# Altium footprint library ref-packages.PCBLIB: 1543 footprints (part 42 of 103) (continued)
## PLCC-S28 [mil]
pads (28):
  round 48 hole 32: 1(50,150)
  oct 48x48 hole 32: 2(-50,250) 3(-50,150) 4(-150,250) 5(-250,150) 6(-150,150) 7(-250,50) 8(-150,50) 9(-250,-50) 10(-150,-50) 11(-250,-150) 12(-150,-250) 13(-150,-150) 14(-50,-250) 15(-50,-150) 16(50,-250) 17(50,-150) 18(150,-250) 19(250,-150) 20(150,-150) 21(250,-50) 22(150,-50) 23(250,50) 24(150,50) 25(250,150) 26(150,250) 27(150,150) 28(50,250)
Top Overlay:
  lines w6: -225,-185 -310,-270 -270,-310 -185,-225 ; -225,-115 -310,-115 -310,-85 -225,-85 ; -225,-15 -310,-15 -310,15 -225,15 ; -225,85 -310,85 -310,115 -225,115 ; -225,175 -175,225 ; -115,-225 -115,-310 -85,-310 -85,-225 ; -115,225 -115,310 -85,310 -85,225 ; -15,-225 -15,-310 15,-310 15,-225 ; -15,225 -15,310 15,310 15,225 ; 0,125 0,220 ; 85,-225 85,-310 115,-310 115,-225 ; 85,225 85,310 115,310 115,225 ; 165,-225 225,-225 225,-165 ; 185,225 270,310 310,270 225,185 ; 225,-115 310,-115 310,-85 225,-85 ; 225,-15 310,-15 310,15 225,15 ; 225,85 310,85 310,115 225,115 ; -350,-350 -350,300 -300,350 350,350 350,-350 -350,-350
  lines w20: -25,195 25,195 0,220 -25,195
Mechanical 16:
  circle w6: c-100,100 r50
  circle w6: c100,100 r50
  circle w6: c-100,-100 r50
  circle w6: c100,-100 r50
  lines w6: -225,-185 -225,-165 -310,-165 -310,-135 -225,-135 -225,-115 ; -225,-85 -225,-65 -310,-65 -310,-35 -225,-35 -225,-15 ; -225,15 -225,35 -310,35 -310,65 -225,65 -225,85 ; -225,115 -225,135 -310,135 -310,165 -225,165 -225,175 ; -185,-225 -165,-225 -165,-310 -135,-310 -135,-225 -115,-225 ; -175,225 -165,225 -165,310 -135,310 -135,225 -115,225 ; -85,-225 -65,-225 -65,-310 -35,-310 -35,-225 -15,-225 ; -85,225 -65,225 -65,310 -35,310 -35,225 -15,225 ; 15,-225 35,-225 35,-310 65,-310 65,-225 85,-225 ; 15,225 35,225 35,310 65,310 65,225 85,225 ; 115,-225 135,-225 135,-310 165,-310 165,-225 ; 115,225 135,225 135,310 165,310 165,225 185,225 ; 225,-165 310,-165 310,-135 225,-135 225,-115 ; 225,-85 225,-65 310,-65 310,-35 225,-35 225,-15 ; 225,15 225,35 310,35 310,65 225,65 225,85 ; 225,115 225,135 310,135 310,165 225,165 225,185

## PLCC-S32 [mil]
pads (32):
  round 48 hole 32: 1(50,200)
  oct 48x48 hole 32: 2(-50,300) 3(-50,200) 4(-150,300) 5(-250,200) 6(-150,200) 7(-250,100) 8(-150,100) 9(-250,0) 10(-150,0) 11(-250,-100) 12(-150,-100) 13(-250,-200) 14(-150,-300) 15(-150,-200) 16(-50,-300) 17(-50,-200) 18(50,-300) 19(50,-200) 20(150,-300) 21(250,-200) 22(150,-200) 23(250,-100) 24(150,-100) 25(250,0) 26(150,0) 27(250,100) 28(150,100) 29(250,200) 30(150,300) 31(150,200) 32(50,300)
Top Overlay:
  lines w6: -225,-235 -310,-320 -270,-360 -185,-275 ; -225,-165 -310,-165 -310,-135 -225,-135 ; -225,-65 -310,-65 -310,-35 -225,-35 ; -225,35 -310,35 -310,65 -225,65 ; -225,135 -310,135 -310,165 -225,165 ; -225,225 -175,275 ; -115,-275 -115,-360 -85,-360 -85,-275 ; -115,275 -115,360 -85,360 -85,275 ; -15,-275 -15,-360 15,-360 15,-275 ; -15,275 -15,360 15,360 15,275 ; 0,175 0,265 ; 85,-275 85,-360 115,-360 115,-275 ; 85,275 85,360 115,360 115,275 ; 165,-275 225,-275 225,-215 ; 185,275 270,360 310,320 225,235 ; 225,-165 310,-165 310,-135 225,-135 ; 225,-65 310,-65 310,-35 225,-35 ; 225,35 310,35 310,65 225,65 ; 225,135 310,135 310,165 225,165 ; -350,-400 -350,350 -300,400 350,400 350,-400 -350,-400
  lines w20: -25,240 25,240 0,265 -25,240
Mechanical 16:
  circle w6: c-100,100 r50
  circle w6: c100,100 r50
  circle w6: c-100,-100 r50
  circle w6: c100,-100 r50
  lines w6: -225,-235 -225,-215 -310,-215 -310,-185 -225,-185 -225,-165 ; -225,-135 -225,-115 -310,-115 -310,-85 -225,-85 -225,-65 ; -225,-35 -225,-15 -310,-15 -310,15 -225,15 -225,35 ; -225,65 -225,85 -310,85 -310,115 -225,115 -225,135 ; -225,165 -225,185 -310,185 -310,215 -225,215 -225,225 ; -185,-275 -165,-275 -165,-360 -135,-360 -135,-275 -115,-275 ; -175,275 -165,275 -165,360 -135,360 -135,275 -115,275 ; -85,-275 -65,-275 -65,-360 -35,-360 -35,-275 -15,-275 ; -85,275 -65,275 -65,360 -35,360 -35,275 -15,275 ; 15,-275 35,-275 35,-360 65,-360 65,-275 85,-275 ; 15,275 35,275 35,360 65,360 65,275 85,275 ; 115,-275 135,-275 135,-360 165,-360 165,-275 ; 115,275 135,275 135,360 165,360 165,275 185,275 ; 225,-215 310,-215 310,-185 225,-185 225,-165 ; 225,-135 225,-115 310,-115 310,-85 225,-85 225,-65 ; 225,-35 225,-15 310,-15 310,15 225,15 225,35 ; 225,65 225,85 310,85 310,115 225,115 225,135 ; 225,165 225,185 310,185 310,215 225,215 225,235

## PLCC-S44 [mil]
pads (44):
  round 48 hole 32: 1(50,250)
  oct 48x48 hole 32: 2(-50,350) 3(-50,250) 4(-150,350) 5(-150,250) 6(-250,350) 7(-350,250) 8(-250,250) 9(-350,150) 10(-250,150) 11(-350,50) 12(-250,50) 13(-350,-50) 14(-250,-50) 15(-350,-150) 16(-250,-150) 17(-350,-250) 18(-250,-350) 19(-250,-250) 20(-150,-350) 21(-150,-250) 22(-50,-350) 23(-50,-250) 24(50,-350) 25(50,-250) 26(150,-350) 27(150,-250) 28(250,-350) 29(350,-250) 30(250,-250) 31(350,-150) 32(250,-150) 33(350,-50) 34(250,-50) 35(350,50) 36(250,50) 37(350,150) 38(250,150) 39(350,250) 40(250,350) 41(250,250) 42(150,350) 43(150,250) 44(50,350)
Top Overlay:
  circle w6: c-100,100 r50
  circle w6: c100,100 r50
  circle w6: c-100,-100 r50
  circle w6: c100,-100 r50
  lines w6: -325,-285 -410,-370 -370,-410 -285,-325 ; -325,-215 -410,-215 -410,-185 -325,-185 ; -325,-115 -410,-115 -410,-85 -325,-85 ; -325,-15 -410,-15 -410,15 -325,15 ; -325,85 -410,85 -410,115 -325,115 ; -325,185 -410,185 -410,215 -325,215 ; -325,275 -275,325 ; -215,-325 -215,-410 -185,-410 -185,-325 ; -215,325 -215,410 -185,410 -185,325 ; -115,-325 -115,-410 -85,-410 -85,-325 ; -115,325 -115,410 -85,410 -85,325 ; -25,175 0,200 ; -15,-325 -15,-410 15,-410 15,-325 ; -15,325 -15,410 15,410 15,325 ; 85,-325 85,-410 115,-410 115,-325 ; 85,325 85,410 115,410 115,325 ; 185,-325 185,-410 215,-410 215,-325 ; 185,325 185,410 215,410 215,325 ; 265,-325 325,-325 325,-265 ; 285,325 370,410 410,370 325,285 ; 325,-215 410,-215 410,-185 325,-185 ; 325,-115 410,-115 410,-85 325,-85 ; 325,-15 410,-15 410,15 325,15 ; 325,85 410,85 410,115 325,115 ; 325,185 410,185 410,215 325,215 ; -450,-450 -450,400 -400,450 450,450 450,-450 -450,-450
  lines w20: -25,175 25,175 0,200 0,125
Mechanical 16:
  lines w6: -325,-285 -325,-265 -410,-265 -410,-235 -325,-235 -325,-215 ; -325,-185 -325,-165 -410,-165 -410,-135 -325,-135 -325,-115 ; -325,-85 -325,-65 -410,-65 -410,-35 -325,-35 -325,-15 ; -325,15 -325,35 -410,35 -410,65 -325,65 -325,85 ; -325,115 -325,135 -410,135 -410,165 -325,165 -325,185 ; -325,215 -325,235 -410,235 -410,265 -325,265 -325,275 ; -285,-325 -265,-325 -265,-410 -235,-410 -235,-325 -215,-325 ; -275,325 -265,325 -265,410 -235,410 -235,325 -215,325 ; -185,-325 -165,-325 -165,-410 -135,-410 -135,-325 -115,-325 ; -185,325 -165,325 -165,410 -135,410 -135,325 -115,325 ; -85,-325 -65,-325 -65,-410 -35,-410 -35,-325 -15,-325 ; -85,325 -65,325 -65,410 -35,410 -35,325 -15,325 ; 15,-325 35,-325 35,-410 65,-410 65,-325 85,-325 ; 15,325 35,325 35,410 65,410 65,325 85,325 ; 115,-325 135,-325 135,-410 165,-410 165,-325 185,-325 ; 115,325 135,325 135,410 165,410 165,325 185,325 ; 215,-325 235,-325 235,-410 265,-410 265,-325 ; 215,325 235,325 235,410 265,410 265,325 285,325 ; 325,-265 410,-265 410,-235 325,-235 325,-215 ; 325,-185 325,-165 410,-165 410,-135 325,-135 325,-115 ; 325,-85 325,-65 410,-65 410,-35 325,-35 325,-15 ; 325,15 325,35 410,35 410,65 325,65 325,85 ; 325,115 325,135 410,135 410,165 325,165 325,185 ; 325,215 325,235 410,235 410,265 325,265 325,285

## PLCC-S52 [mil]
pads (52):
  round 48 hole 32: 1(0,400)
  oct 48x48 hole 32: 2(0,300) 3(-100,400) 4(-100,300) 5(-200,400) 6(-200,300) 7(-300,400) 8(-400,300) 9(-300,300) 10(-400,200) 11(-300,200) 12(-400,100) 13(-300,100) 14(-400,0) 15(-300,0) 16(-400,-100) 17(-300,-100) 18(-400,-200) 19(-300,-200) 20(-400,-300) 21(-300,-400) 22(-300,-300) 23(-200,-400) 24(-200,-300) 25(-100,-400) 26(-100,-300) 27(0,-400) 28(0,-300) 29(100,-400) 30(100,-300) 31(200,-400) 32(200,-300) 33(300,-400) 34(400,-300) 35(300,-300) 36(400,-200) 37(300,-200) 38(400,-100) 39(300,-100) 40(400,0) 41(300,0) 42(400,100) 43(300,100) 44(400,200) 45(300,200) 46(400,300) 47(300,400) 48(300,300) 49(200,400) 50(200,300) 51(100,400) 52(100,300)
Top Overlay:
  circle w6: c-100,100 r50
  circle w6: c100,100 r50
  circle w6: c-100,-100 r50
  circle w6: c100,-100 r50
  lines w6: -375,-335 -460,-420 -420,-460 -335,-375 ; -375,-265 -460,-265 -460,-235 -375,-235 ; -375,-165 -460,-165 -460,-135 -375,-135 ; -375,-65 -460,-65 -460,-35 -375,-35 ; -375,35 -460,35 -460,65 -375,65 ; -375,135 -460,135 -460,165 -375,165 ; -375,235 -460,235 -460,265 -375,265 ; -375,325 -325,375 ; -265,-375 -265,-460 -235,-460 -235,-375 ; -265,375 -265,460 -235,460 -235,375 ; -165,-375 -165,-460 -135,-460 -135,-375 ; -165,375 -165,460 -135,460 -135,375 ; -65,-375 -65,-460 -35,-460 -35,-375 ; -65,375 -65,460 -35,460 -35,375 ; 35,-375 35,-460 65,-460 65,-375 ; 35,375 35,460 65,460 65,375 ; 135,-375 135,-460 165,-460 165,-375 ; 135,375 135,460 165,460 165,375 ; 235,-375 235,-460 265,-460 265,-375 ; 235,375 235,460 265,460 265,375 ; 315,-375 375,-375 375,-315 ; 335,375 420,460 460,420 375,335 ; 375,-265 460,-265 460,-235 375,-235 ; 375,-165 460,-165 460,-135 375,-135 ; 375,-65 460,-65 460,-35 375,-35 ; 375,35 460,35 460,65 375,65 ; 375,135 460,135 460,165 375,165 ; 375,235 460,235 460,265 375,265 ; -500,-500 -500,450 -450,500 500,500 500,-500 -500,-500
  lines w20: 0,125 0,200 ; 0,200 25,175 -25,175 0,200
Mechanical 16:
  lines w6: -375,-335 -375,-315 -460,-315 -460,-285 -375,-285 -375,-265 ; -375,-235 -375,-215 -460,-215 -460,-185 -375,-185 -375,-165 ; -375,-135 -375,-115 -460,-115 -460,-85 -375,-85 -375,-65 ; -375,-35 -375,-15 -460,-15 -460,15 -375,15 -375,35 ; -375,65 -375,85 -460,85 -460,115 -375,115 -375,135 ; -375,165 -375,185 -460,185 -460,215 -375,215 -375,235 ; -375,265 -375,285 -460,285 -460,315 -375,315 -375,325 ; -335,-375 -315,-375 -315,-460 -285,-460 -285,-375 -265,-375 ; -325,375 -315,375 -315,460 -285,460 -285,375 -265,375 ; -235,-375 -215,-375 -215,-460 -185,-460 -185,-375 -165,-375 ; -235,375 -215,375 -215,460 -185,460 -185,375 -165,375 ; -135,-375 -115,-375 -115,-460 -85,-460 -85,-375 -65,-375 ; -135,375 -115,375 -115,460 -85,460 -85,375 -65,375 ; -35,-375 -15,-375 -15,-460 15,-460 15,-375 35,-375 ; -35,375 -15,375 -15,460 15,460 15,375 35,375 ; 65,-375 85,-375 85,-460 115,-460 115,-375 135,-375 ; 65,375 85,375 85,460 115,460 115,375 135,375 ; 165,-375 185,-375 185,-460 215,-460 215,-375 235,-375 ; 165,375 185,375 185,460 215,460 215,375 235,375 ; 265,-375 285,-375 285,-460 315,-460 315,-375 ; 265,375 285,375 285,460 315,460 315,375 335,375 ; 375,-315 460,-315 460,-285 375,-285 375,-265 ; 375,-235 375,-215 460,-215 460,-185 375,-185 375,-165 ; 375,-135 375,-115 460,-115 460,-85 375,-85 375,-65 ; 375,-35 375,-15 460,-15 460,15 375,15 375,35 ; 375,65 375,85 460,85 460,115 375,115 375,135 ; 375,165 375,185 460,185 460,215 375,215 375,235 ; 375,265 375,285 460,285 460,315 375,315 375,335

## PLCC-S68 [mil]
pads (68):
  oct 48x48 hole 32: 1(0,500) 2(0,400) 3(-100,500) 4(-100,400) 5(-200,500) 6(-200,400) 7(-300,500) 8(-300,400) 9(-400,500) 10(-500,400) 11(-400,400) 12(-500,300) 13(-400,300) 14(-500,200) 15(-400,200) 16(-500,100) 17(-400,100) 18(-500,0) 19(-400,0) 20(-500,-100) 21(-400,-100) 22(-500,-200) 23(-400,-200) 24(-500,-300) 25(-400,-300) 26(-500,-400) 27(-400,-500) 28(-400,-400) 29(-300,-500) 30(-300,-400) 31(-200,-500) 32(-200,-400) 33(-100,-500) 34(-100,-400) 35(0,-500) 36(0,-400) 37(100,-500) 38(100,-400) 39(200,-500) 40(200,-400) 41(300,-500) 42(300,-400) 43(400,-500) 44(500,-400) 45(400,-400) 46(500,-300) 47(400,-300) 48(500,-200) 49(400,-200) 50(500,-100) 51(400,-100) 52(500,0) 53(400,0) 54(500,100) 55(400,100) 56(500,200) 57(400,200) 58(500,300) 59(400,300) 60(500,400) 61(400,500) 62(400,400) 63(300,500) 64(300,400) 65(200,500) 66(200,400) 67(100,500) 68(100,400)
Top Overlay:
  circle w6: c275,275 r25
  circle w6: c-275,275 r25
  circle w6: c-275,-275 r25
  circle w6: c275,-275 r25
  circle w6: c-150,150 r71
  circle w6: c150,150 r71
  circle w6: c-150,-150 r71
  circle w6: c150,-150 r71
  lines w6: -475,-435 -560,-520 -520,-560 -435,-475 ; -475,-365 -560,-365 -560,-335 -475,-335 ; -475,-265 -560,-265 -560,-235 -475,-235 ; -475,-165 -560,-165 -560,-135 -475,-135 ; -475,-65 -560,-65 -560,-35 -475,-35 ; -475,35 -560,35 -560,65 -475,65 ; -475,135 -560,135 -560,165 -475,165 ; -475,235 -560,235 -560,265 -475,265 ; -475,335 -560,335 -560,365 -475,365 ; -475,425 -425,475 ; -365,-475 -365,-560 -335,-560 -335,-475 ; -365,475 -365,560 -335,560 -335,475 ; -265,-475 -265,-560 -235,-560 -235,-475 ; -265,475 -265,560 -235,560 -235,475 ; -165,-475 -165,-560 -135,-560 -135,-475 ; -165,475 -165,560 -135,560 -135,475 ; -65,-475 -65,-560 -35,-560 -35,-475 ; -65,475 -65,560 -35,560 -35,475 ; 35,-475 35,-560 65,-560 65,-475 ; 35,475 35,560 65,560 65,475 ; 135,-475 135,-560 165,-560 165,-475 ; 135,475 135,560 165,560 165,475 ; 235,-475 235,-560 265,-560 265,-475 ; 235,475 235,560 265,560 265,475 ; 335,-475 335,-560 365,-560 365,-475 ; 335,475 335,560 365,560 365,475 ; 415,-475 475,-475 475,-415 ; 435,475 520,560 560,520 475,435 ; 475,-365 560,-365 560,-335 475,-335 ; 475,-265 560,-265 560,-235 475,-235 ; 475,-165 560,-165 560,-135 475,-135 ; 475,-65 560,-65 560,-35 475,-35 ; 475,35 560,35 560,65 475,65 ; 475,135 560,135 560,165 475,165 ; 475,235 560,235 560,265 475,265 ; 475,335 560,335 560,365 475,365 ; -600,-600 -600,550 -550,600 600,600 600,-600 -600,-600
  lines w20: 0,175 0,250 ; 0,250 25,225 -25,225 0,250
Mechanical 16:
  drawing of 178 lines, arcs and shapes, not listed

## PLCC-S84 [mil]
pads (84):
  oct 48x48 hole 32: 1(0,600) 2(0,500) 3(-100,600) 4(-100,500) 5(-200,600) 6(-200,500) 7(-300,600) 8(-300,500) 9(-400,600) 10(-400,500) 11(-500,600) 12(-600,500) 13(-500,500) 14(-600,400) 15(-500,400) 16(-600,300) 17(-500,300) 18(-600,200) 19(-500,200) 20(-600,100) 21(-500,100) 22(-600,0) 23(-500,0) 24(-600,-100) 25(-500,-100) 26(-600,-200) 27(-500,-200) 28(-600,-300) 29(-500,-300) 30(-600,-400) 31(-500,-400) 32(-600,-500) 33(-500,-600) 34(-500,-500) 35(-400,-600) 36(-400,-500) 37(-300,-600) 38(-300,-500) 39(-200,-600) 40(-200,-500) 41(-100,-600) 42(-100,-500) 43(0,-600) 44(0,-500) 45(100,-600) 46(100,-500) 47(200,-600) 48(200,-500) 49(300,-600) 50(300,-500) 51(400,-600) 52(400,-500) 53(500,-600) 54(600,-500) 55(500,-500) 56(600,-400) 57(500,-400) 58(600,-300) 59(500,-300) 60(600,-200) 61(500,-200) 62(600,-100) 63(500,-100) 64(600,0) 65(500,0) 66(600,100) 67(500,100) 68(600,200) 69(500,200) 70(600,300) 71(500,300) 72(600,400) 73(500,400) 74(600,500) 75(500,600) 76(500,500) 77(400,600) 78(400,500) 79(300,600) 80(300,500) 81(200,600) 82(200,500) 83(100,600) 84(100,500)
Top Overlay:
  circle w6: c275,275 r25
  circle w6: c-275,275 r25
  circle w6: c-275,-275 r25
  circle w6: c275,-275 r25
  circle w6: c-150,150 r71
  circle w6: c150,150 r71
  circle w6: c-150,-150 r71
  circle w6: c150,-150 r71
  lines w6: -575,-535 -660,-620 -620,-660 -535,-575 ; -575,-465 -660,-465 -660,-435 -575,-435 ; -575,-365 -660,-365 -660,-335 -575,-335 ; -575,-265 -660,-265 -660,-235 -575,-235 ; -575,-165 -660,-165 -660,-135 -575,-135 ; -575,-65 -660,-65 -660,-35 -575,-35 ; -575,35 -660,35 -660,65 -575,65 ; -575,135 -660,135 -660,165 -575,165 ; -575,235 -660,235 -660,265 -575,265 ; -575,335 -660,335 -660,365 -575,365 ; -575,435 -660,435 -660,465 -575,465 ; -575,525 -525,575 ; -465,-575 -465,-660 -435,-660 -435,-575 ; -465,575 -465,660 -435,660 -435,575 ; -365,-575 -365,-660 -335,-660 -335,-575 ; -365,575 -365,660 -335,660 -335,575 ; -265,-575 -265,-660 -235,-660 -235,-575 ; -265,575 -265,660 -235,660 -235,575 ; -165,-575 -165,-660 -135,-660 -135,-575 ; -165,575 -165,660 -135,660 -135,575 ; -65,-575 -65,-660 -35,-660 -35,-575 ; -65,575 -65,660 -35,660 -35,575 ; 35,-575 35,-660 65,-660 65,-575 ; 35,575 35,660 65,660 65,575 ; 135,-575 135,-660 165,-660 165,-575 ; 135,575 135,660 165,660 165,575 ; 235,-575 235,-660 265,-660 265,-575 ; 235,575 235,660 265,660 265,575 ; 335,-575 335,-660 365,-660 365,-575 ; 335,575 335,660 365,660 365,575 ; 435,-575 435,-660 465,-660 465,-575 ; 435,575 435,660 465,660 465,575 ; 515,-575 575,-575 575,-515 ; 535,575 620,660 660,620 575,535 ; 575,-465 660,-465 660,-435 575,-435 ; 575,-365 660,-365 660,-335 575,-335 ; 575,-265 660,-265 660,-235 575,-235 ; 575,-165 660,-165 660,-135 575,-135 ; 575,-65 660,-65 660,-35 575,-35 ; 575,35 660,35 660,65 575,65 ; 575,135 660,135 660,165 575,165 ; 575,235 660,235 660,265 575,265 ; 575,335 660,335 660,365 575,365 ; 575,435 660,435 660,465 575,465 ; -700,-700 -700,650 -650,700 700,700 700,-700 -700,-700
  lines w20: 0,175 0,250 ; 0,250 25,225 -25,225 0,250
Mechanical 16:
  drawing of 218 lines, arcs and shapes, not listed

## PLCC-SM44 [mil]
pads (44):
  rect 102x26 smd: 1(-350,0) 2(-350,-50) 3(-350,-100) 4(-350,-150) 5(-350,-200) 6(-350,-250) 18(350,-250) 19(350,-200) 20(350,-150) 21(350,-100) 22(350,-50) 23(350,0) 24(350,50) 25(350,100) 26(350,150) 27(350,200) 28(350,250) 40(-350,250) 41(-350,200) 42(-350,150) 43(-350,100) 44(-350,50)
  rect 26x102 smd: 7(-250,-350) 8(-200,-350) 9(-150,-350) 10(-100,-350) 11(-50,-350) 12(0,-350) 13(50,-350) 14(100,-350) 15(150,-350) 16(200,-350) 17(250,-350) 29(250,350) 30(200,350) 31(150,350) 32(100,350) 33(50,350) 34(0,355) 35(-50,350) 36(-100,350) 37(-150,350) 38(-200,350) 39(-250,350)
Top Overlay:
  circle w6: c-100,-100 r50
  circle w6: c-100,100 r50
  circle w6: c150,-100 r50
  circle w6: c150,100 r50
  lines w6: -410,-270 -410,-230 ; -410,-220 -410,-180 ; -410,-170 -410,-130 ; -410,-120 -410,-80 ; -410,-70 -410,-30 ; -410,-20 -410,20 ; -410,30 -410,70 ; -410,80 -410,120 ; -410,130 -410,170 ; -410,180 -410,220 ; -410,230 -410,270 ; -325,-270 -325,-305 -300,-330 -270,-330 ; -325,270 -325,295 -410,380 -370,420 -285,335 -270,335 ; -270,-410 -230,-410 ; -270,410 -230,410 ; -220,-410 -180,-410 ; -220,410 -180,410 ; -170,-410 -130,-410 ; -170,410 -130,410 ; -120,-410 -80,-410 ; -120,410 -80,410 ; -70,-410 -30,-410 ; -70,410 -30,410 ; -20,-410 20,-410 ; -20,410 20,410 ; 30,-410 70,-410 ; 30,410 70,410 ; 80,-410 120,-410 ; 80,410 120,410 ; 130,-410 170,-410 ; 130,410 170,410 ; 180,-410 220,-410 ; 180,410 220,410 ; 230,-410 270,-410 ; 230,410 270,410 ; 270,-325 280,-325 370,-415 410,-370 325,-285 325,-270 ; 270,325 295,325 325,295 325,270 ; 410,-270 410,-230 ; 410,-220 410,-180 ; 410,-170 410,-130 ; 410,-120 410,-80 ; 410,-70 410,-30 ; 410,-20 410,20 ; 410,30 410,70 ; 410,80 410,120 ; 410,130 410,170 ; 410,180 410,220 ; 410,230 410,270 ; -435,-395 -435,435 435,435 435,-435 -405,-435 -435,-395
  lines w20: -205,0 -280,0 ; -280,0 -255,25 -255,-25 -280,0
Mechanical 16:
  lines w6: -410,-270 -325,-270 ; -410,-230 -325,-230 -325,-220 -410,-220 ; -410,-180 -325,-180 -325,-170 -410,-170 ; -410,-130 -325,-130 -325,-120 -410,-120 ; -410,-80 -325,-80 -325,-70 -410,-70 ; -410,-30 -325,-30 -325,-20 -410,-20 ; -410,20 -325,20 -325,30 -410,30 ; -410,70 -325,70 -325,80 -410,80 ; -410,120 -325,120 -325,130 -410,130 ; -410,170 -325,170 -325,180 -410,180 ; -410,220 -325,220 -325,230 -410,230 ; -410,270 -325,270 ; -270,-410 -270,-330 ; -270,335 -270,410 ; -230,-410 -230,-325 -220,-325 -220,-410 ; -230,410 -230,325 -220,325 -220,410 ; -180,-410 -180,-325 -170,-325 -170,-410 ; -180,410 -180,325 -170,325 -170,410 ; -130,-410 -130,-325 -120,-325 -120,-410 ; -130,410 -130,325 -120,325 -120,410 ; -80,-410 -80,-325 -70,-325 -70,-410 ; -80,410 -80,325 -70,325 -70,410 ; -30,-410 -30,-325 -20,-325 -20,-410 ; -30,410 -30,325 -20,325 -20,410 ; 20,-410 20,-325 30,-325 30,-410 ; 20,410 20,325 30,325 30,410 ; 70,-410 70,-325 80,-325 80,-410 ; 70,410 70,325 80,325 80,410 ; 120,-410 120,-325 130,-325 130,-410 ; 120,410 120,325 130,325 130,410 ; 170,-410 170,-325 180,-325 180,-410 ; 170,410 170,325 180,325 180,410 ; 220,-410 220,-325 230,-325 230,-410 ; 220,410 220,325 230,325 230,410 ; 270,-410 270,-325 ; 270,325 270,410 ; 325,-270 410,-270 ; 325,270 410,270 ; 410,-230 325,-230 325,-220 410,-220 ; 410,-180 325,-180 325,-170 410,-170 ; 410,-130 325,-130 325,-120 410,-120 ; 410,-80 325,-80 325,-70 410,-70 ; 410,-30 325,-30 325,-20 410,-20 ; 410,20 325,20 325,30 410,30 ; 410,70 325,70 325,80 410,80 ; 410,120 325,120 325,130 410,130 ; 410,170 325,170 325,180 410,180 ; 410,220 325,220 325,230 410,230

## PLCC-SR32 [mil]
pads (32):
  round 63 hole 27.56: 1(50,200)
  oct 63x63 hole 27.56: 2(-50,300) 3(-50,200) 4(-150,300) 5(-250,200) 6(-150,200) 7(-250,100) 8(-150,100) 9(-250,0) 10(-150,0) 11(-250,-100) 12(-150,-100) 13(-250,-200) 14(-150,-300) 15(-150,-200) 16(-50,-300) 17(-50,-200) 18(50,-300) 19(50,-200) 20(150,-300) 21(250,-200) 22(150,-200) 23(250,-100) 24(150,-100) 25(250,0) 26(150,0) 27(250,100) 28(150,100) 29(250,200) 30(150,300) 31(150,200) 32(50,300)
Top Overlay:
  rectangle: -20,75 20,150
  rectangle: -35,140 35,155
  rectangle: -25,155 25,165
  rectangle: -15,165 15,175
  rectangle: -5,175 5,185
  rectangle: -45,140 -35,145
  rectangle: -40,145 -35,150
  rectangle: -30,155 -25,160
  rectangle: -20,165 -15,170
  rectangle: -10,175 -5,180
  rectangle: 5,175 10,180
  rectangle: 15,165 20,170
  rectangle: 25,155 30,160
  rectangle: 35,140 45,145
  rectangle: 35,145 40,150
  lines w6: -290,-215 -310,-215 -310,-185 -290,-185 ; -290,-115 -310,-115 -310,-85 -290,-85 ; -290,-15 -310,-15 -310,15 -290,15 ; -290,85 -310,85 -310,115 -290,115 ; -290,185 -310,185 -310,215 -290,215 ; -275,-165 -310,-165 -310,-135 -275,-135 ; -275,-65 -310,-65 -310,-35 -275,-35 ; -275,35 -310,35 -310,65 -275,65 ; -275,135 -310,135 -310,165 -275,165 ; -225,-225 -225,-235 -310,-320 -270,-360 -185,-275 -175,-275 ; -225,225 -175,275 ; -165,-340 -165,-360 -135,-360 -135,-340 ; -165,340 -165,360 -135,360 -135,340 ; -135.35,-64.65 cw(c-100,-100) -100,-150 ; -135.35,135.35 cw(c-100,100) -100,50 ; -115,-325 -115,-360 -85,-360 -85,-325 ; -115,325 -115,360 -85,360 -85,325 ; -65,-340 -65,-360 -35,-360 -35,-340 ; -65,340 -65,360 -35,360 -35,340 ; -15,-325 -15,-360 15,-360 15,-325 ; -15,325 -15,360 15,360 15,325 ; 35,-340 35,-360 65,-360 65,-340 ; 35,340 35,360 65,360 65,340 ; 85,-325 85,-360 115,-360 115,-325 ; 85,325 85,360 115,360 115,325 ; 100,-50 ccw(c100,-100) 135.35,-135.35 ; 100,150 ccw(c100,100) 135.35,64.65 ; 135,-340 135,-360 165,-360 165,-340 ; 135,340 135,360 165,360 165,340 ; 175,-275 225,-275 225,-225 ; 175,275 185,275 270,360 310,320 225,235 225,225 ; 270,-165 310,-165 310,-135 270,-135 ; 270,-65 310,-65 310,-35 270,-35 ; 270,35 310,35 310,65 270,65 ; 270,135 310,135 310,165 270,165 ; 290,-215 310,-215 310,-185 290,-185 ; 290,-115 310,-115 310,-85 290,-85 ; 290,-15 310,-15 310,15 290,15 ; 290,85 310,85 310,115 290,115 ; 290,185 310,185 310,215 290,215 ; -360,-385 -360,350 -300,410 335,410 cw(c335,385) 360,385 360,-385 cw(c335,-385) 335,-410 -335,-410 cw(c-335,-385) -360,-385 ; -50,140 50,140 0,190 -50,140
  text "32" at -50,-25 h77.5
Mechanical 16:
  lines w6: -290,-215 -225,-215 -225,-225 ; -290,-185 -225,-185 -225,-165 -275,-165 ; -290,-115 -225,-115 -225,-135 -275,-135 ; -290,-85 -225,-85 -225,-65 -275,-65 ; -290,-15 -225,-15 -225,-35 -275,-35 ; -290,15 -225,15 -225,35 -275,35 ; -290,85 -225,85 -225,65 -275,65 ; -290,115 -225,115 -225,135 -275,135 ; -290,185 -225,185 -225,165 -275,165 ; -290,215 -225,215 -225,225 ; -175,-275 -165,-275 -165,-340 ; -175,275 -165,275 -165,340 ; -135.35,-64.65 ccw(c-100,-100.01) -150,-100 ccw(c-100,-100) -100,-150 ; -135.35,135.35 ccw(c-100,99.99) -150,100 ccw(c-100,100) -100,50 ; -135,-340 -135,-275 -115,-275 -115,-325 ; -135,340 -135,275 -115,275 -115,325 ; -85,-325 -85,-275 -65,-275 -65,-340 ; -85,325 -85,275 -65,275 -65,340 ; -35,-340 -35,-275 -15,-275 -15,-325 ; -35,340 -35,275 -15,275 -15,325 ; 15,-325 15,-275 35,-275 35,-340 ; 15,325 15,275 35,275 35,340 ; 65,-340 65,-275 85,-275 85,-325 ; 65,340 65,275 85,275 85,325 ; 100,-50 cw(c100,-100) 150,-100 cw(c100,-99.99) 135.35,-135.35 ; 100,150 cw(c100,100) 150,100 cw(c100,100.01) 135.35,64.65 ; 115,-325 115,-275 135,-275 135,-340 ; 115,325 115,275 135,275 135,340 ; 165,-340 165,-275 175,-275 ; 165,340 165,275 175,275 ; 225,-225 225,-215 290,-215 ; 225,225 225,215 290,215 ; 270,-165 225,-165 225,-185 290,-185 ; 270,-135 225,-135 225,-115 290,-115 ; 270,-65 225,-65 225,-85 290,-85 ; 270,-35 225,-35 225,-15 290,-15 ; 270,35 225,35 225,15 290,15 ; 270,65 225,65 225,85 290,85 ; 270,135 225,135 225,115 290,115 ; 270,165 225,165 225,185 290,185

## PLCCR18 [mil]
pads (18):
  rect 23.62x86.61 smd: 1(-25,208.66) 2(-75,208.66) 8(-75,-208.66) 9(-25,-208.66) 10(25,-208.66) 11(75,-208.66) 17(75,208.66) 18(25,208.66)
  rect 86.61x23.62 smd: 3(-141.73,100) 4(-141.73,50) 5(-141.73,0) 6(-141.73,-50) 7(-141.73,-100) 12(141.73,-100) 13(141.73,-50) 14(141.73,0) 15(141.73,50) 16(141.73,100)
Mechanical 16:
  circle w24: c0,169.29 r11.81
  rectangle: -35.24,210.63 -14.37,233.46
  rectangle: -85.24,210.63 -64.37,233.46
  rectangle: -166.54,89.76 -143.7,110.63
  rectangle: -166.54,39.76 -143.7,60.63
  rectangle: -166.54,-10.24 -143.7,10.63
  rectangle: -166.54,-60.24 -143.7,-39.37
  rectangle: -166.54,-110.24 -143.7,-89.37
  rectangle: -85.63,-233.46 -64.76,-210.63
  rectangle: -35.63,-233.46 -14.76,-210.63
  rectangle: 14.37,-233.46 35.24,-210.63
  rectangle: 64.37,-233.46 85.24,-210.63
  rectangle: 143.7,-110.63 166.54,-89.76
  rectangle: 143.7,-60.63 166.54,-39.76
  rectangle: 143.7,-10.63 166.54,10.24
  rectangle: 143.7,39.37 166.54,60.24
  rectangle: 143.7,89.37 166.54,110.24
  rectangle: 64.76,210.63 85.63,233.46
  rectangle: 14.76,210.63 35.63,233.46
  lines w8: -138.19,-209.84 138.19,-209.84 138.19,209.84 -105.12,209.84 -138.19,176.77 -138.19,-209.84
Mechanical 27:
  lines w7.87: -212.72,-271.77 212.72,-271.77 212.72,271.77 -212.72,271.77 -212.72,-271.77

## PLCCR18L [mil]
pads (18):
  rect 23.62x86.61 smd: 1(-25,240.16) 2(-75,240.16) 8(-75,-240.16) 9(-25,-240.16) 10(25,-240.16) 11(75,-240.16) 17(75,240.16) 18(25,240.16)
  rect 86.61x23.62 smd: 3(-141.73,100) 4(-141.73,50) 5(-141.73,0) 6(-141.73,-50) 7(-141.73,-100) 12(141.73,-100) 13(141.73,-50) 14(141.73,0) 15(141.73,50) 16(141.73,100)
Mechanical 16:
  circle w24: c0,200.79 r11.81
  rectangle: -35.24,242.13 -14.37,264.96
  rectangle: -85.24,242.13 -64.37,264.96
  rectangle: -166.54,89.76 -143.7,110.63
  rectangle: -166.54,39.76 -143.7,60.63
  rectangle: -166.54,-10.24 -143.7,10.63
  rectangle: -166.54,-60.24 -143.7,-39.37
  rectangle: -166.54,-110.24 -143.7,-89.37
  rectangle: -85.63,-264.96 -64.76,-242.13
  rectangle: -35.63,-264.96 -14.76,-242.13
  rectangle: 14.37,-264.96 35.24,-242.13
  rectangle: 64.37,-264.96 85.24,-242.13
  rectangle: 143.7,-110.63 166.54,-89.76
  rectangle: 143.7,-60.63 166.54,-39.76
  rectangle: 143.7,-10.63 166.54,10.24
  rectangle: 143.7,39.37 166.54,60.24
  rectangle: 143.7,89.37 166.54,110.24
  rectangle: 64.76,242.13 85.63,264.96
  rectangle: 14.76,242.13 35.63,264.96
  lines w8: -138.19,-241.34 138.19,-241.34 138.19,241.34 -105.12,241.34 -138.19,208.27 -138.19,-241.34
Mechanical 27:
  lines w7.87: -212.72,-311.14 212.72,-311.14 212.72,311.14 -212.72,311.14 -212.72,-311.14